# Altium footprint library mastermind.PCBLIB: 1061 footprints (part 22 of 67)
Each footprint in its own frame and in the unit in brackets; x right, y up, seen from the top. Pads: shape width x height; smd on the part's side, far side on the other; paste and mask are expansions set on the pad; w line width, h text height; cw(c..) or ccw(c..) is an arc to the next point about the centre after c.
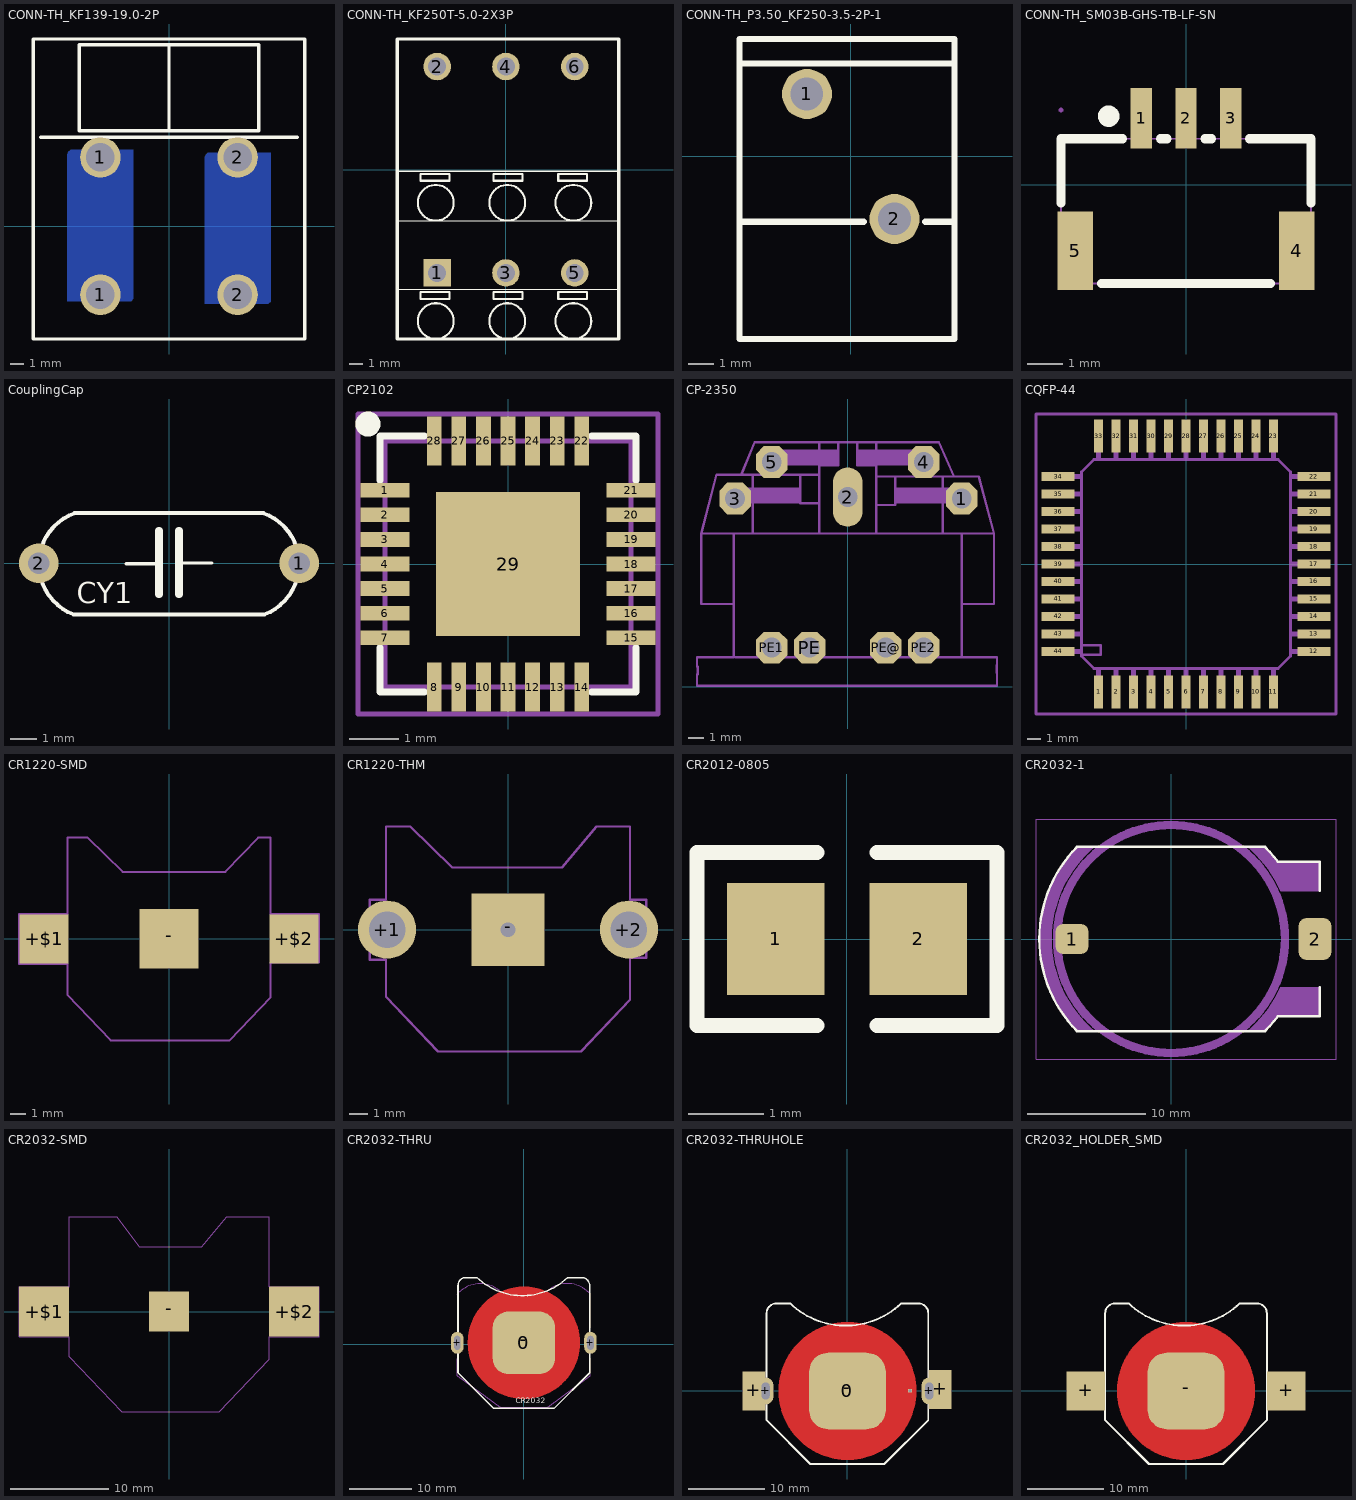
[diagram p21: the footprints below, top view; thin cyan lines are the x and y axes]

## CONN-TH_KF139-19.0-2P [mm]
pads (4):
  round 3 / inner round 4.8 / far side round 4.8 hole 2.1: 1(-5.08,-5.08) 1(-5.08,5.08) 2(5.08,-5.08) 2(5.08,5.08)
Bottom Layer:
  region: -7.52,5.28 -7.52,-5.56 -2.8,-5.56 -2.64,-5.4 -2.64,5.64 -7.28,5.64 -7.44,5.48
  region: 2.64,5.08 2.64,-5.76 7.36,-5.76 7.52,-5.6 7.52,5.44 2.88,5.44 2.72,5.28
Top Overlay:
  lines w0.2: 0,7.04 0,13.4
  lines w0.254: -9.5,6.58 9.5,6.58 ; -10.055,-8.36 -10.055,13.84 10.055,13.84 10.055,-8.36 -10.055,-8.36 ; -6.64,7.04 6.64,7.04 6.64,13.4 -6.64,13.4 -6.64,7.04
Bottom Solder:
  lines w3: -5.08,-4.84 -5.08,5.08 ; 5.08,-4.84 5.08,5.08

## CONN-TH_KF250T-5.0-2X3P [mm]
pads (6):
  rect 2x2 hole 1.3: 1(-5,-7.5)
  round 2 hole 1.3: 2(-5,7.5) 3(0,-7.5) 4(0,7.5) 5(5,-7.5) 6(5,7.5)
Top Overlay:
  circle w0.15: c4.9,-11 r1.3
  circle w0.15: c4.9,-2.4 r1.3
  circle w0.15: c-5.1,-11 r1.3
  circle w0.15: c0.1,-11 r1.3
  circle w0.15: c0.1,-2.4 r1.3
  circle w0.15: c-5.1,-2.4 r1.3
  lines w0.06: -7.9,-8.7 8.2,-8.7 ; -7.9,-3.7 8.2,-3.7
  lines w0.12: -7.9,-0.1 8.2,-0.1
  lines w0.15: -6.2,-9.4 -6.2,-8.9 -4.1,-8.9 -4.1,-9.4 -6.2,-9.4 ; -6.2,-0.8 -6.2,-0.3 -4.1,-0.3 -4.1,-0.8 -6.2,-0.8 ; -0.9,-9.4 -0.9,-8.9 1.2,-8.9 1.2,-9.4 -0.9,-9.4 ; -0.9,-0.8 -0.9,-0.3 1.2,-0.3 1.2,-0.8 -0.9,-0.8 ; 3.8,-9.4 3.8,-8.9 5.9,-8.9 5.9,-9.4 3.8,-9.4 ; 3.8,-0.8 3.8,-0.3 5.9,-0.3 5.9,-0.8 3.8,-0.8
  lines w0.2: -7.9,-12.3 8.2,-12.3
  lines w0.254: -7.9,-12.3 -7.9,9.5 8.2,9.5 8.2,-12.3

## CONN-TH_P3.50_KF250-3.5-2P-1 [mm]
pads (2):
  round 2 hole 1.3: 1(-1.75,2.5) 2(1.75,-2.5)
Top Overlay:
  lines w0.254: -4.45,-2.613 0.524,-2.613 ; -4.45,3.72 4.15,3.72 ; 2.976,-2.613 4.15,-2.613 ; -4.45,-7.3 4.15,-7.3 4.15,4.7 -4.45,4.7 -4.45,-7.3

## CONN-TH_SM03B-GHS-TB-LF-SN [mm]
pads (5):
  rect 0.6x1.7 smd paste+0 mask+0.051: 1(-1.25,1.854) 2(0,1.854) 3(1.25,1.854)
  rect 1x2.2 smd paste+0 mask+0.051: 4(3.1,-1.854) 5(-3.1,-1.854)
Top Overlay:
  circle w0.3: c-2.164,1.913 r0.15
  lines w0.254: -3.5,-0.523 -3.5,1.283 -1.781,1.283 ; -2.369,-2.767 2.369,-2.767 ; -0.719,1.283 -0.531,1.283 ; 0.531,1.283 0.719,1.283 ; 1.781,1.283 3.5,1.283 3.5,-0.523
Mechanical 6:
  circle w0.3: c-1.247,2.327 r0.15
Mechanical 15:
  region: -3.1,-0.941 -2.9,-0.941 -2.9,-2.767 -3.1,-2.767
  region: 2.9,-0.941 3.1,-0.941 3.1,-2.767 2.9,-2.767
  region: 1.15,1.083 1.15,2.083 1.35,2.083 1.35,1.083
  region: -0.1,1.083 -0.1,2.083 0.1,2.083 0.1,1.083
  region: -1.35,1.083 -1.35,2.083 -1.15,2.083 -1.15,1.083
  region: -3.44,2.083 -3.44,2.108 -3.475,2.143 -3.525,2.143 -3.56,2.108 -3.56,2.083 -3.56,2.058 -3.525,2.023 -3.475,2.023 -3.44,2.058
  lines w0.051: -3.5,-2.767 3.5,-2.767 3.5,1.283 -3.5,1.283 -3.5,-2.767
3D body "SM03B-GHS-TB.stp": height 4.25, standoff -0.05, extent -3.5,-2.767 3.5,2.083

## CouplingCap [mm] "VARISTOR"
pads (2):
  round 1.524 hole 0.82: 1(5,0) 2(-5,0)
Top Overlay:
  lines w0.12: -1.651,-0.025 -0.381,-0.025 ; 0.457,0 1.651,0
  lines w0.152: -3.678,-1.969 cw(c-2.925,-0.034) -3.629,1.919 3.629,1.919 cw(c2.925,-0.034) 3.678,-1.969 -3.678,-1.969
  lines w0.3: -0.381,-1.194 -0.381,1.245 ; 0.381,-1.194 0.381,1.245
  text "CY1" at -3.548,-1.538 h0.8
3D body "CAPRB1000W60L1000T400H1300-180_Vishay_H_Seriess.STEP": height 3, standoff -13, extent -5.749,-1.994 5.834,2.006

## CP2102 [mm]
pads (29):
  rect 1x0.3 smd: 1(-2.5,1.5) 2(-2.5,1) 3(-2.5,0.5) 4(-2.5,0) 5(-2.5,-0.5) 6(-2.5,-1) 7(-2.5,-1.5) 15(2.5,-1.5) 16(2.5,-1) 17(2.5,-0.5) 18(2.5,0) 19(2.5,0.5) 20(2.5,1) 21(2.5,1.5)
  rect 0.3x1 smd: 8(-1.5,-2.5) 9(-1,-2.5) 10(-0.5,-2.5) 11(0,-2.5) 12(0.5,-2.5) 13(1,-2.5) 14(1.5,-2.5) 22(1.5,2.5) 23(1,2.5) 24(0.5,2.5) 25(0,2.5) 26(-0.5,2.5) 27(-1,2.5) 28(-1.5,2.5)
  rect 2.921x2.921 smd paste-3.2: 29(0,0)
Top Overlay:
  circle w0.254: c-2.844,2.844 r0.127
  lines w0.15: -2.6,-1.7 -2.6,-2.6 -1.7,-2.6 ; -2.6,1.7 -2.6,2.6 ; -2.591,2.6 -1.7,2.6 ; 1.7,-2.6 2.6,-2.6 2.6,-1.7 ; 1.7,2.6 2.6,2.6 2.6,1.7
Top Paste:
  region: 1.524,-0.381 1.524,0.381 0.762,0.381 0.762,-0.381
  region: -0.762,-0.381 -0.762,0.381 -1.524,0.381 -1.524,-0.381
  region: 0.381,-0.381 0.381,0.381 -0.381,0.381 -0.381,-0.381
  region: 1.524,-1.524 1.524,-0.762 0.762,-0.762 0.762,-1.524
  region: 0.381,-1.524 0.381,-0.762 -0.381,-0.762 -0.381,-1.524
  region: -1.524,-1.524 -0.762,-1.524 -0.762,-0.762 -1.524,-0.762
  region: -1.524,0.762 -0.762,0.762 -0.762,1.524 -1.524,1.524
  region: -0.381,1.524 -0.381,0.762 0.381,0.762 0.381,1.524
  region: 0.762,1.524 0.762,0.762 1.524,0.762 1.524,1.524
Mechanical 13:
  lines w0.1: -2.5,-2.5 2.5,-2.5 2.5,2.5 -2.5,2.5 -2.5,-2.5
Mechanical 15:
  lines w0.1: -0.5,0 0.5,0 ; 0,-0.5 0,0.5 ; -3.048,-3.048 3.048,-3.048 3.048,3.048 -3.048,3.048 -3.048,-3.048
3D body "User Library-QFN-28-0_5.STEP": height 1, standoff 0, extent -2.5,-2.5 2.5,2.5

## CP-2350 [mil]
pads (9):
  oct 83.27x83.27 hole 52: 1(300,495.28) 3(-296.06,495.28) 4(200,591.34) 5(-200,591.34) PE(-100,103.15) PE1(-200,103.15) PE2(200,103.15) PE@(100,103.15)
  oval 78x156 hole 52: 2(0,499.21)
Mechanical 2:
  lines w6: -345,558.15 -385,403.15 ; -300,248.15 -300,218.15 ; -300,358.15 -300,403.15 ; -295,78.15 -145,78.15 ; -55,78.15 55,78.15 ; 145,78.15 300,78.15 ; 300,248.15 300,218.15 ; 300,358.15 300,403.15 ; 345,553.15 385,403.15 ; -385,403.15 -385,218.15 -300,218.15 ; -385,403.15 -300,403.15 ; -300,218.15 -300,78.15 -396.38,78.15 -396.38,53.15 -394.69,53.15 -394.69,33.15 -396.38,33.15 -396.38,3.15 392.87,3.15 392.87,33.15 392.44,37.09 392.44,57.09 392.87,53.15 392.87,78.15 300,78.15 ; -300,403.15 -75,403.15 ; -75,403.15 75,403.15 ; -75,403.15 -75,483.15 ; -75,483.15 -75,558.15 ; -75,483.15 -125,483.15 -125,558.15 -75,558.15 ; -75,558.15 -75,583.15 ; -75,583.15 -75,643.15 -25,643.15 ; -75,583.15 -25,583.15 -25,643.15 ; -25,643.15 25,643.15 ; 25,643.15 75,643.15 75,583.15 ; 25,643.15 25,583.15 75,583.15 ; 75,403.15 300,403.15 ; 75,403.15 75,478.15 ; 75,478.15 75,553.15 ; 75,478.15 125,478.15 125,553.15 75,553.15 ; 75,553.15 75,583.15 ; 300,78.15 300,218.15 ; 300,218.15 385,218.15 385,403.15 ; 300,403.15 385,403.15
Mechanical 8:
  region: 125,483.15 125,523.15 315,523.15 315,483.15
  region: 25,583.15 25,623.15 215,623.15 215,583.15
  region: -215,583.15 -215,623.15 -25,623.15 -25,583.15
  region: -315,483.15 -315,523.15 -125,523.15 -125,483.15
  lines w6: -345,558.15 -280,558.15 ; -300,248.15 -300,358.15 ; -250,403.15 -250,558.15 ; -145,78.15 -55,78.15 ; -125,558.15 -250,558.15 ; -75,643.15 -245,643.15 -280,558.15 ; 55,78.15 145,78.15 ; 75,643.15 240,643.15 280,553.15 ; 125,553.15 250,553.15 ; 250,403.15 250,553.15 ; 300,248.15 300,358.15 ; 345,553.15 280,553.15 ; -280,558.15 -250,558.15 ; 250,553.15 280,553.15

## CQFP-44 [mm]
pads (44):
  rect 0.65x2.4 smd: 1(-6.35,-9.3) 2(-5.08,-9.3) 3(-3.81,-9.3) 4(-2.54,-9.3) 5(-1.27,-9.3) 6(0,-9.3) 7(1.27,-9.3) 8(2.54,-9.3) 9(3.81,-9.3) 10(5.08,-9.3) 11(6.35,-9.3) 23(6.35,9.3) 24(5.08,9.3) 25(3.81,9.3) 26(2.54,9.3) 27(1.27,9.3) 28(0,9.3) 29(-1.27,9.3) 30(-2.54,9.3) 31(-3.81,9.3) 32(-5.08,9.3) 33(-6.35,9.3)
  rect 2.4x0.65 smd: 12(9.3,-6.35) 13(9.3,-5.08) 14(9.3,-3.81) 15(9.3,-2.54) 16(9.3,-1.27) 17(9.3,0) 18(9.3,1.27) 19(9.3,2.54) 20(9.3,3.81) 21(9.3,5.08) 22(9.3,6.35) 34(-9.3,6.35) 35(-9.3,5.08) 36(-9.3,3.81) 37(-9.3,2.54) 38(-9.3,1.27) 39(-9.3,0) 40(-9.3,-1.27) 41(-9.3,-2.54) 42(-9.3,-3.81) 43(-9.3,-5.08) 44(-9.3,-6.35)
Mechanical 2:
  lines w0.203: -7.5,-5.9 -6.2,-5.9 -6.2,-6.6 -7.6,-6.6 ; -7.6,-6.6 -7.6,-6.7 -6.7,-7.6 6.7,-7.6 7.6,-6.7 7.6,6.7 6.7,7.6 -6.7,7.6 -7.6,6.7 -7.6,-6.6
Mechanical 8:
  drawing of 44 lines, arcs and shapes, not listed
Mechanical 29 (Mech34):
  lines w0.2: -10.903,-10.903 -10.903,10.903 10.903,10.903 10.903,-10.903 -10.903,-10.903

## CR1220-SMD [mm]
pads (3):
  rect 3.2x3.2 smd: +$1(-8.2,0) +$2(8.2,0)
  rect 3.9x3.9 smd: -(0,0)
Mechanical 2:
  circle w0.127: c-8.254,0 r0.916
  circle w0.127: c8.4,0.154 r0.916
  lines w0.127: -9.84,-1.64 -6.66,-1.64 -6.66,-3.672 -3.826,-6.66 3.98,-6.66 6.66,-3.826 6.66,-1.54 9.84,-1.54 9.84,1.64 6.66,1.64 6.66,6.652 5.842,6.652 3.702,4.404 -3.048,4.404 -5.334,6.652 -6.66,6.652 -6.66,1.64 -9.84,1.64 -9.84,-1.64

## CR1220-THM [mil]
pads (3):
  round 125 hole 78.74: +1(-260,0) +2(260,0)
  rect 156x156 hole 31.5: -(0,0)
Mechanical 2:
  lines w5: -297.4,-64.57 -262.2,-64.57 -262.2,-144.57 -150.63,-262.2 156.69,-262.2 262.2,-150.63 262.2,-60.63 297.4,-60.63 297.4,64.57 262.2,64.57 262.2,221.89 190,221.89 115.75,133.39 -120,133.39 -210,221.89 -262.2,221.89 -262.2,64.57 -297.4,64.57 -297.4,-64.57

## CR2012-0805 [mm]
pads (2):
  rect 1.3x1.5 smd: 1(-0.946,0) 2(0.954,0)
Top Overlay:
  lines w0.2: -0.396,-1.15 -1.996,-1.15 -1.996,1.15 -0.396,1.15 ; 0.404,-1.15 2.004,-1.15 2.004,1.15 0.404,1.15
3D body: height 0.76, standoff 0, extent -1.524,-0.699 1.524,0.699

## CR2032-1 [mil]
pads (2):
  rrect50% 110x100 smd: 1(-330,0)
  rrect50% 110x140 smd: 2(480,0)
Top Overlay:
  lines w8: 495.61,-161.42 495.61,-256.94 355.95,-256.94 cw(c0,0) 313.76,-307.01 -313.76,-307.01 cw(c0,0) -313.76,307.01 313.76,307.01 cw(c0,0) 355.92,256.94 495.61,256.94 495.61,161.42
Mechanical 13:
  circle w28: c0,0 r380
  region: 365.54,161.44 360.75,171.88 350.28,192.33 338.65,212.14 325.9,231.25 312.07,249.6 297.21,267.12 281.37,283.76 264.59,299.46 255.88,306.94 255.88,306.87 313.76,306.87 313.76,307.01 319.49,301.16 330.5,289.03 341.05,276.5 351.13,263.58 355.92,256.94 495.61,256.94 495.61,161.42
  region: -313.76,-307.01 -325.66,-294.85 -347.49,-268.77 -367.25,-241.08 -384.8,-211.94 -400.05,-181.53 -412.89,-150.03 -423.26,-117.64 -431.1,-84.53 -436.34,-50.92 -438.98,-17.01 -438.98,17.01 -436.34,50.92 -431.1,84.53 -423.26,117.64 -412.89,150.03 -400.05,181.53 -384.8,211.94 -367.25,241.08 -347.49,268.77 -325.65,294.85 -313.76,307.01 -255.88,307.01 -255.88,306.94 -269.07,295.44 -293.88,270.77 -316.44,244.03 -336.58,215.41 -354.13,185.14 -368.97,153.46 -380.98,120.59 -390.06,86.8 -396.16,52.35 -399.22,17.49 -399.22,-17.49 -396.16,-52.35 -390.06,-86.8 -380.98,-120.59 -368.97,-153.46 -354.13,-185.14 -336.58,-215.41 -316.44,-244.03 -293.88,-270.77 -269.07,-295.44 -255.88,-306.94 -255.88,-307.01
  region: 313.76,-307.01 319.49,-301.15 330.5,-289.02 341.06,-276.49 351.14,-263.57 355.93,-256.93 355.95,-256.94 495.61,-256.94 495.61,-161.42 365.54,-161.42 365.54,-161.44 360.75,-171.88 350.28,-192.33 338.65,-212.14 325.9,-231.25 312.07,-249.6 297.21,-267.12 281.37,-283.76 264.59,-299.46 255.88,-306.94 255.88,-307.01
  lines w2: -255.88,-306.94 cw(c0,0) -255.88,306.94 ; 255.88,-306.94 ccw(c0,0) 365.54,-161.44 ; 255.88,306.87 313.76,306.87 ; 255.88,306.94 cw(c0,0) 365.54,161.44 ; 255.88,307.01 -313.76,307.01 ccw(c0,0) -313.76,-307.01 255.88,-307.01 313.76,-307.01 ccw(c0,0) 355.93,-256.93 495.61,-256.94 495.61,-161.42 365.54,-161.42 ; 313.76,307.01 cw(c0,0) 355.92,256.94 495.61,256.94 495.61,161.42 365.5,161.42
Mechanical 14:
  lines w2: -450,-400 550,-400 550,400 -450,400 -450,-400
  text ".Designator" at -65,-25 h50
3D body "User Library-BLP2032M-G.STEP": height 191.34, standoff 0, extent -425.12,-297.24 510.32,297.25

## CR2032-SMD [mil]
pads (3):
  rect 200x200 smd: +$1(-500,0) +$2(500,0)
  rect 160x160 smd: -(0,0)
Top Solder:
  region: -354.33,0 -354.33,17.41 -350.92,52.05 -344.13,86.2 -334.02,119.51 -320.7,151.68 -304.29,182.38 -284.94,211.33 -262.86,238.24 -238.24,262.86 -211.33,284.94 -182.38,304.29 -151.68,320.7 -119.51,334.02 -86.2,344.13 -52.05,350.92 -17.41,354.33 0,354.33 17.41,354.33 52.05,350.92 86.2,344.13 119.51,334.02 151.68,320.7 182.38,304.29 211.33,284.94 238.24,262.86 262.86,238.24 284.94,211.33 304.29,182.38 320.7,151.68 334.02,119.51 344.13,86.2 350.92,52.05 354.33,17.41 354.33,0 354.33,-17.41 350.92,-52.05 344.13,-86.2 334.02,-119.51 320.7,-151.68 304.29,-182.38 284.94,-211.33 262.86,-238.24 238.24,-262.86 211.33,-284.94 182.38,-304.29 151.68,-320.7 119.51,-334.02 86.2,-344.13 52.05,-350.92 17.41,-354.33 0,-354.33 -17.41,-354.33 -52.05,-350.92 -86.2,-344.13 -119.51,-334.02 -151.68,-320.7 -182.38,-304.29 -211.33,-284.94 -238.24,-262.86 -262.86,-238.24 -284.94,-211.33 -304.29,-182.38 -320.7,-151.68 -334.02,-119.51 -344.13,-86.2 -350.92,-52.05 -354.33,-17.41
Mechanical 2:
  circle w5: c500,10 r36.06
  circle w5: c-510,0 r36.06
  lines w5: -600,-100 -600,100 -400,100 -400,380 -210,380 -120,260 130,260 230,380 400,380 400,100 600,100 600,-100 400,-100 400,-190 200,-400 -190,-400 -400,-180 -400,-100 -600,-100

## CR2032-THRU [mm]
pads (4):
  round 18 on Top Solder paste+0: 0(0,0.219)
  rrect100% 2x3.5 hole 1 slot 2.2 at 90 deg: +(-10.668,0.219) +(10.668,0.219)
  rrect50% 10x10 smd paste-9: -(0,0.219)
Top Layer:
  circle w5: c0,0.219 r6.5
  region: -17.501,-19.186
Top Overlay:
  lines w0.254: -4.457,-10.287 4.814,-10.287 10.529,-4.572 10.529,9.398 ccw(c9.259,9.398) 9.259,10.668 6.973,10.668 ; -4.203,-10.287 -4.838,-10.287 -10.553,-4.572 -10.553,9.398 cw(c-9.283,9.398) -9.283,10.668 -7.505,10.668 ccw(c-0.245,18.31) 7.015,10.668
  text "CR2032" at -1.32,-9.791 h1.52
Mechanical 1:
  lines w0.2: -10.67,-2.321 -10.67,-5.03 -3.791,-10.093 3.839,-10.093 10.63,-5.03 10.63,-2.321 ; -10.67,2.759 -10.673,7.969 -10.393,8.289 -10.109,8.556 ; -10.115,8.536 cw(c-6.996,4.854) -3.878,8.536 ; -3.908,8.586 ccw(c-0.013,15.418) 3.829,8.556 cw(c6.948,4.873) 10.066,8.556 10.35,8.289 10.63,7.969 ; 10.63,2.739 10.63,7.972
3D body "User Library-CR2032-3002.step": height 3.96, standoff 0, extent -15.217,-10.017 15.517,10.037

## CR2032-THRUHOLE [mm]
pads (7):
  round 18 on Top Solder paste+0: 0(0,0)
  rect 3x5.08 smd: +(-12.201,0) +(12.081,0.2)
  rrect100% 2x3.5 hole 1 slot 2.2 at 90 deg: +(-10.668,0) +(10.668,0)
  rrect50% 10x10 smd paste-9: -(0,0)
  rect 0.5x0.5 / inner rect 1.524x1.524 / far side rect 1.524x1.524 hole 0.4: -(8.15,0.03)
Top Layer:
  circle w5: c0,0 r6.5
Top Overlay:
  lines w0.254: -4.445,-9.525 4.826,-9.525 10.541,-3.81 10.541,10.16 ccw(c9.271,10.16) 9.271,11.43 6.985,11.43 ; -4.191,-9.525 -4.826,-9.525 -10.541,-3.81 -10.541,10.16 cw(c-9.271,10.16) -9.271,11.43 -7.493,11.43 ccw(c-0.233,19.072) 7.027,11.43
3D body "User Library-CR2032-3002.step": height 3.96, standoff 0, extent -15.367,-10.274 15.367,9.779

## CR2032_HOLDER_SMD [mm]
pads (4):
  rect 5.08x5.08 smd: +(-13.081,0) +(13.081,0)
  rrect50% 10x10 smd paste-9: -(0,0)
  round 18 on Top Solder paste+0: -(0,0)
Top Layer:
  circle w5: c0,0 r6.5
Top Overlay:
  lines w0.254: -4.445,-9.525 4.826,-9.525 10.541,-3.81 10.541,10.16 ccw(c9.271,10.16) 9.271,11.43 6.985,11.43 ; -4.191,-9.525 -4.826,-9.525 -10.541,-3.81 -10.541,10.16 cw(c-9.271,10.16) -9.271,11.43 -7.493,11.43 ccw(c-0.233,19.072) 7.027,11.43
3D body "User Library-CR2032-3002.step": height 3.96, standoff 0, extent -15.367,-10.274 15.367,9.779